# Altium footprint library MyComponents_v2.5.PcbLib: 403 footprints (part 12 of 26)
Each footprint in its own frame and in the unit in brackets; x right, y up, seen from the top. Pads: shape width x height; smd on the part's side, far side on the other; paste and mask are expansions set on the pad; w line width, h text height; cw(c..) or ccw(c..) is an arc to the next point about the centre after c.
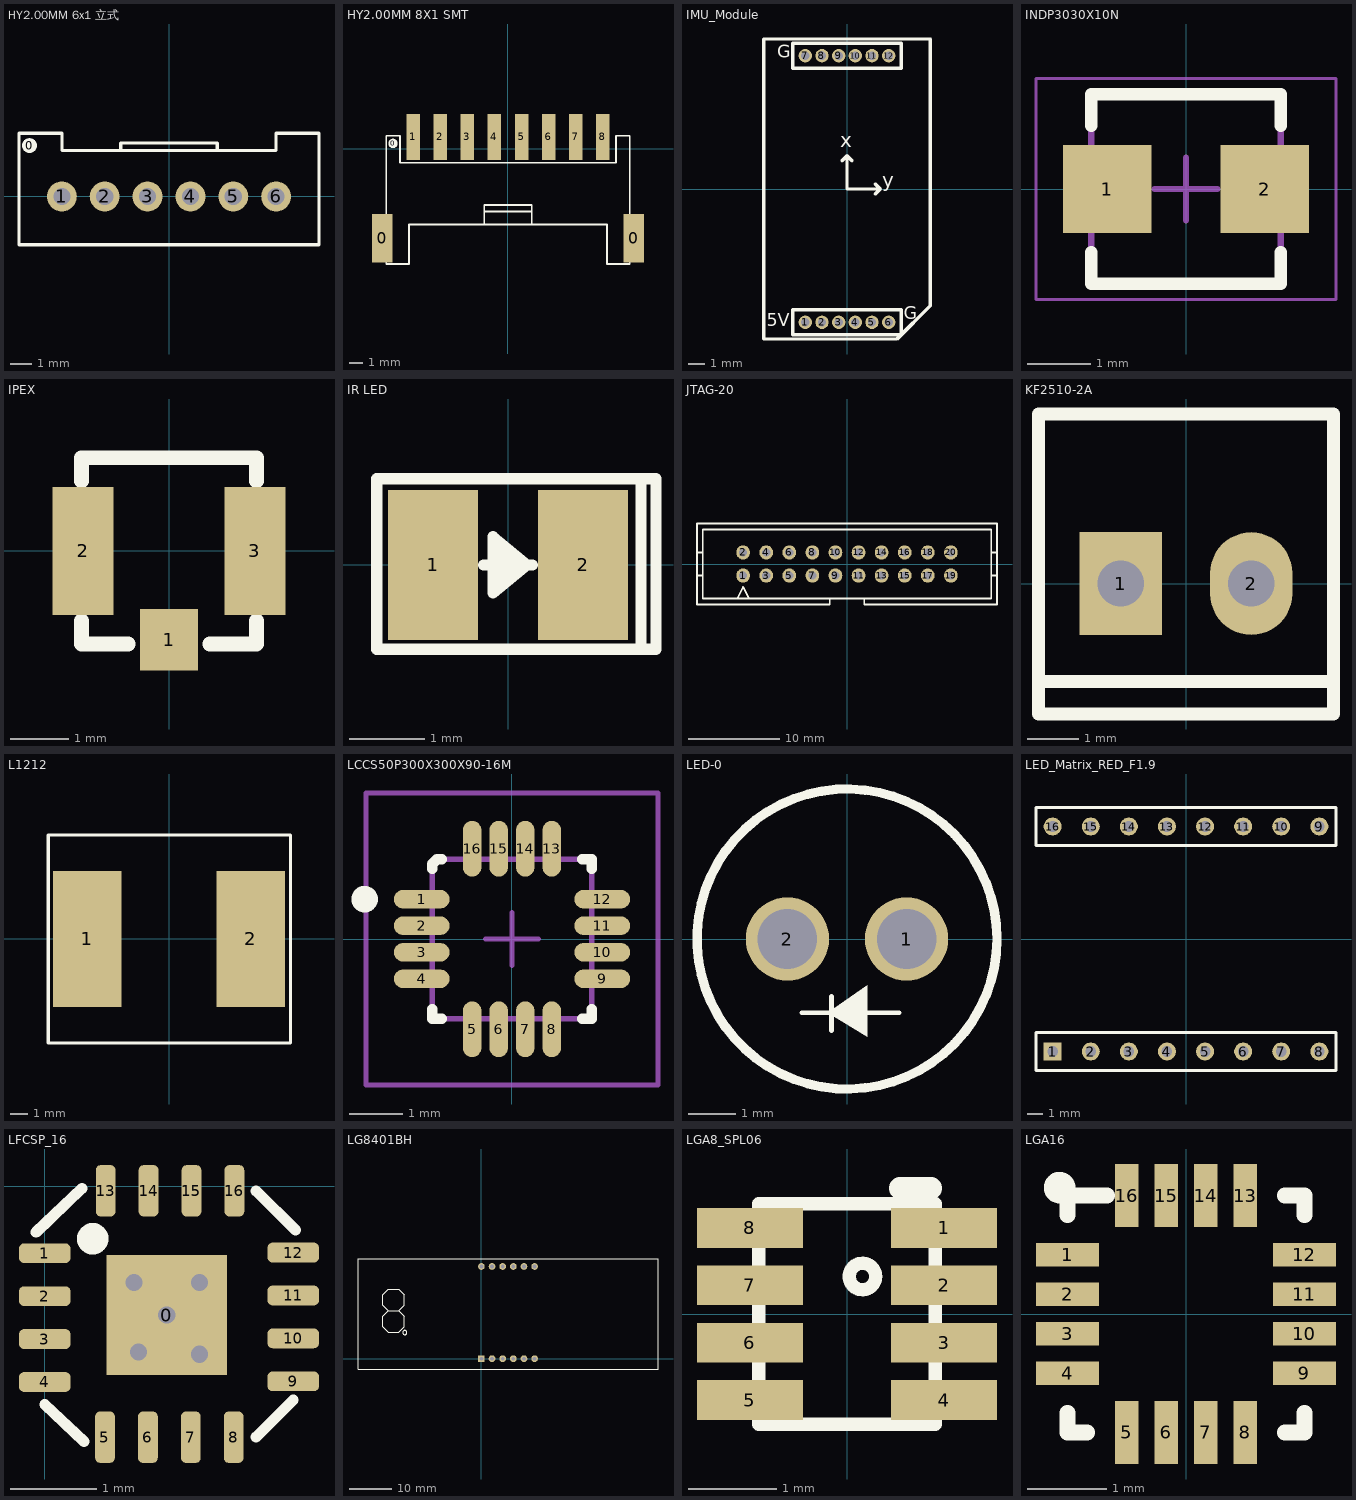
[diagram p11: the footprints below, top view; thin cyan lines are the x and y axes]

## HY2.00MM 6x1 立式 [mm]
pads (7):
  round 0.7 on Top Overlay: 0(-6.51,2.375)
  round 1.4 hole 0.8: 1(-5,0) 2(-3,0) 3(-1,0) 4(1,0) 5(3,0) 6(5,0)
Top Overlay:
  lines w0.15: -2.25,2.15 -2.25,2.5 2.25,2.5 2.25,2.15 ; 7,2.946 7,-2.25 -7,-2.25 -7,2.95 -5,2.95 -5,2.15 5,2.15 5,2.95 7,2.95

## HY2.00MM 8X1 SMT [mm]
pads (11):
  rect 1.5x3.6 smd: 0(-9.3,-6.635) 0(9.3,-6.635)
  round 0.7 on Top Overlay: 0(-8.51,0.391)
  rect 1x3.4 smd: 1(-7,0.865) 2(-5,0.865) 3(-3,0.865) 4(-1,0.865) 5(1,0.865) 6(3,0.865) 7(5,0.865) 8(7,0.865)
Top Overlay:
  lines w0.127: -8,-1.042 -8,0.957 ; -8,-1.041 -1.915,-1.041 8,-1.041 ; -8,0.966 -9,0.966 -9,-8.534 -7.327,-8.534 -7.327,-5.613 -4.58,-5.613 -3,-5.613 0.58,-5.613 7.327,-5.613 7.327,-8.534 9,-8.534 9,0.966 8,0.966 ; -1.75,-5.613 -1.75,-4.648 ; -0.354,-4.648 1.754,-4.648 1.754,-4.166 -0.354,-4.166 ; 0.354,-4.648 -1.754,-4.648 -1.754,-4.166 0.354,-4.166 ; 1.75,-5.613 1.75,-4.648 ; 8,-1.042 8,0.957

## IMU_Module [mm]
pads (12):
  round 0.8 hole 0.5: 1(-2.5,-8) 2(-1.5,-8) 3(-0.5,-8) 4(0.5,-8) 5(1.5,-8) 6(2.5,-8) 7(-2.5,8) 8(-1.5,8) 9(-0.5,8) 10(0.5,8) 11(1.5,8) 12(2.5,8)
Top Overlay:
  lines w0.2: -0.3,1.7 0,2 ; 0.3,1.7 0,2 ; 1.7,-0.3 2,0 ; 1.7,0.3 2,0 ; -3.25,7.25 -3.25,7.25 ; -3.25,7.25 -3.25,8.75 ; -3.25,7.25 3.25,7.25 3.25,8.75 -3.25,8.75 ; -3.25,8.75 -3.25,8.75 ; 0,2 0,2 ; 0,2 0,0 2,0 ; 2,0 2,0 ; 2,0 2,0 ; 5,9 -5,9 -5,-9 3,-9 5,-7 5,9 ; 5,9 5,9 ; -3.25,-8.75 3.25,-8.75 3.25,-7.25 -3.25,-7.25 -3.25,-8.75
  text "x" at -0.4,2.2 h1.5
  text "y" at 2.1,-0.2 h1.5
  text "5V" at -4.8,-8.5 h1.3
  text "G" at -4.2,7.6 h1.3
  text "G" at 3.4,-8.1 h1.3
3D body "ICM20602+AK8975.step": height 5.2, standoff -0.5, extent -5,-9 5,9
3D body "female_header_1.0mm 6p.STEP": height 2, standoff -2, extent -3.25,7.25 3.25,8.75
3D body "female_header_1.0mm 6p.STEP": height 2, standoff -2, extent -3.25,-8.75 3.25,-7.25

## INDP3030X10N [mm] "Precision Wire Wound Inductor, 2-Leads, Body 3.00x2.95mm, IPC Medium Density"
height 1
pads (2):
  rect 1.4x1.4 smd: 1(-1.25,0) 2(1.25,0)
Top Overlay:
  lines w0.2: -1.5,-1 -1.5,-1.5 1.5,-1.5 1.5,-1 ; -1.5,1 -1.5,1.5 1.5,1.5 1.5,1
Mechanical 13:
  lines w0.1: -1.5,-1.475 1.5,-1.475 1.5,1.475 -1.5,1.475 -1.5,-1.475
Mechanical 15:
  lines w0.05: -2.375,-1.75 2.375,-1.75 2.375,1.75 -2.375,1.75 -2.375,-1.75
  lines w0.1: -0.5,0 0.5,0 ; 0,-0.5 0,0.5
3D body: height 1, standoff 0, extent -1.5,-1.475 1.5,1.475

## IPEX [mm]
pads (3):
  rect 1x1.05 smd: 1(0,-1.525)
  rect 1.05x2.2 smd: 2(-1.475,0) 3(1.475,0)
Top Overlay:
  lines w0.254: -1.5,-1.2 -1.5,-1.6 -0.7,-1.6 ; -1.5,1.2 -1.5,1.6 1.5,1.6 1.5,1.2 ; 0.7,-1.6 1.5,-1.6 1.5,-1.2
3D body "User Library-IPEX.STEP": height 1.25, standoff -0.01, extent -1.5,-1.55 1.5,1.55

## IR LED [mm] "IR  LED for 测评测速模块"
pads (2):
  rect 1.2x2 smd: 1(-1,0) 2(1,0)
Top Overlay:
  lines w0.15: -0.325,0 0.325,0 ; -0.1,-0.15 -0.025,-0.075 -0.025,0.05 -0.2,0.225 -0.2,0.375 ; 1.775,-1.125 1.775,1.125 ; -0.2,0.375 -0.2,-0.375 0.25,0 -0.2,0.375 ; -1.75,-1.125 1.975,-1.125 1.975,1.15 -1.75,1.15 -1.75,-1.125

## JTAG-20 [mm]
pads (20):
  oval 1.5x1.575 hole 0.9: 1(-11.43,-1.27) 2(-11.43,1.27) 3(-8.89,-1.27) 4(-8.89,1.27) 5(-6.35,-1.27) 6(-6.35,1.27) 7(-3.81,-1.27) 8(-3.81,1.27) 9(-1.27,-1.27) 10(-1.27,1.27) 11(1.27,-1.27) 12(1.27,1.27) 13(3.81,-1.27) 14(3.81,1.27) 15(6.35,-1.27) 16(6.35,1.27) 17(8.89,-1.27) 18(8.89,1.27) 19(11.43,-1.27) 20(11.43,1.27)
Top Overlay:
  lines w0.203: -16.51,-1.27 -15.875,-1.27 ; -16.51,1.27 -15.875,1.27 ; -12.065,-3.81 -11.43,-2.54 -10.795,-3.81 ; -8.625,-4.445 -1.905,-4.445 -1.905,-3.81 ; -8.255,-4.445 -16.51,-4.445 -16.51,4.445 16.51,4.445 16.51,-4.445 8.255,-4.445 1.905,-4.445 1.905,-3.81 ; 15.875,-1.27 16.51,-1.27 ; 15.875,1.27 16.51,1.27 ; -1.905,-3.81 -15.875,-3.81 -15.875,3.81 15.875,3.81 15.875,-3.81 1.905,-3.81 ; -1.905,-3.81 1.905,-3.81
3D body "User Library-LP20V.STEP": height 9.46, standoff -3.2, extent -16.459,-4.524 16.561,4.676

## KF2510-2A [mm]
pads (2):
  rect 1.6x2 hole 0.9: 1(-1.27,0)
  oval 1.6x2 hole 0.9: 2(1.27,0)
Top Overlay:
  lines w0.254: -2.87,-1.905 2.87,-1.905 ; -2.87,-2.54 -2.87,3.3 2.87,3.3 2.87,-2.54 -2.87,-2.54
3D body: height 11.2, standoff 3, extent 1.016,-0.254 1.524,0.254
3D body: height 11.2, standoff 3, extent -1.524,-0.254 -1.016,0.254
3D body: height 3, standoff 0, extent -2.794,-1.778 2.794,3.302
3D body: height 11.2, standoff 0, extent -2.794,-2.54 2.794,-1.778

## L1212 [mm]
pads (2):
  rect 4x8 smd: 1(-4.8,0) 2(4.8,0)
Top Overlay:
  lines w0.2: -7.079,-6.1 -7.079,6.1 7.129,6.1 7.129,-6.1 -7.079,-6.1
3D body "Inductor12x12x6.step": height 6.21, standoff -0.09, extent -6.125,-6.1 6.075,6.1

## LCCS50P300X300X90-16M [mm] "LCC, 16-Pins, Body 3.0x3.0mm (max), Pitch 0.50mm, IPC Low Density"
height 0.9
pads (16):
  oval 1.05x0.35 smd: 1(-1.7,0.75) 2(-1.7,0.25) 3(-1.7,-0.25) 4(-1.7,-0.75) 9(1.7,-0.75) 10(1.7,-0.25) 11(1.7,0.25) 12(1.7,0.75)
  oval 0.35x1.05 smd: 5(-0.75,-1.7) 6(-0.25,-1.7) 7(0.25,-1.7) 8(0.75,-1.7) 13(0.75,1.7) 14(0.25,1.7) 15(-0.25,1.7) 16(-0.75,1.7)
Top Overlay:
  circle w0.25: c-2.775,0.75 r0.125
  lines w0.2: -1.5,-1.325 -1.5,-1.5 -1.325,-1.5 ; -1.5,1.325 -1.5,1.412 -1.412,1.5 -1.325,1.5 ; 1.325,-1.5 1.5,-1.5 1.5,-1.325 ; 1.325,1.5 1.5,1.5 1.5,1.325
Mechanical 13:
  lines w0.1: -1.5,-1.5 -1.5,1.412 -1.412,1.5 1.5,1.5 1.5,-1.5 -1.5,-1.5
Mechanical 15:
  lines w0.1: -0.5,0 0.5,0 ; 0,-0.5 0,0.5 ; -2.75,-2.75 -2.75,2.75 2.75,2.75 2.75,-2.75 -2.75,-2.75
3D body: height 0.9, standoff 0, extent -1.5,-1.5 1.5,1.5

## LED-0 [mil] "LED; 2 Leads"
pads (2):
  round 70 hole 50: 1(50,0) 2(-50,0)
Top Overlay:
  circle w7.87: c0,0 r125.98
  region: 17,-39 17,-82 -16,-62
  lines w3.94: -38,-62 44,-62 ; -13,-77 -13,-48

## LED_Matrix_RED_F1.9 [mm] "LED直径1.9mm 边长20mm"
pads (16):
  rect 1.2x1.2 hole 0.7: 1(-8.89,-7.5)
  round 1.2 hole 0.7: 2(-6.35,-7.5) 3(-3.81,-7.5) 4(-1.27,-7.5) 5(1.27,-7.5) 6(3.81,-7.5) 7(6.35,-7.5) 8(8.89,-7.5) 9(8.89,7.5) 10(6.35,7.5) 11(3.81,7.5) 12(1.27,7.5) 13(-1.27,7.5) 14(-3.81,7.5) 15(-6.35,7.5) 16(-8.89,7.5)
Top Overlay:
  lines w0.2: -10,-8.77 10,-8.77 10,-6.23 -10,-6.23 -10,-8.77 ; -10,6.23 -10,8.77 10,8.77 10,6.23 -10,6.23

## LFCSP_16 [mm]
pads (17):
  rect 1.4x1.4 smd: 0(1.422,-1.499)
  rrect50% 0.6x0.23 smd: 1(0,-0.778) 2(0,-1.278) 3(0,-1.778) 4(0,-2.278) 9(2.896,-2.27) 10(2.896,-1.77) 11(2.896,-1.27) 12(2.896,-0.77)
  rrect50% 0.23x0.6 smd: 5(0.702,-2.921) 6(1.202,-2.921) 7(1.702,-2.921) 8(2.202,-2.921) 13(0.71,-0.051) 14(1.21,-0.051) 15(1.71,-0.051) 16(2.21,-0.051)
via 1.803,-1.956 diameter 0.3 hole 0.2
via 1.803,-1.118 diameter 0.3 hole 0.2
via 1.041,-1.118 diameter 0.3 hole 0.2
via 1.092,-1.93 diameter 0.3 hole 0.2
via 1.422,-1.499 diameter 0.3 hole 0.2
Top Overlay:
  lines w0.127: -0.102,-0.533 0.432,-0.025 ; 0,-2.54 0.457,-2.972 ; 2.464,-2.921 2.896,-2.489 ; 2.464,-0.051 2.921,-0.508
  lines w0.254: 0.615,-0.617 cw(c0.559,-0.61) 0.615,-0.614

## LG8401BH [mm] "四位 0.36英寸 数码管"
pads (12):
  rect 1.6x1.6 hole 0.9: 1(0,0)
  round 1.6 hole 0.9: 2(2.54,0) 3(5.08,0) 4(7.62,0) 5(10.16,0) 6(12.7,0) 7(12.7,22) 8(10.16,22) 9(7.62,22) 10(5.08,22) 11(2.54,22) 12(0,22)
Top Overlay:
  circle w0.254: c-18.288,6.223 r0.508
  lines w0.254: -22.225,11.43 -23.495,10.16 -23.495,7.62 -22.225,6.35 -19.685,6.35 -18.415,7.62 -18.415,10.16 -19.685,11.43 ; -22.225,11.43 -23.495,12.7 -23.495,15.24 -22.225,16.51 -19.685,16.51 -18.415,15.24 -18.415,12.7 -19.685,11.43 ; -22.225,11.43 -19.685,11.43 ; -29.45,-2.54 42.15,-2.54 42.15,23.85 -29.45,23.85 -29.45,-2.54

## LGA8_SPL06 [mm] "IST8310"
pads (8):
  rect 1.2x0.45 smd: 1(1.1,0.975) 2(1.1,0.325) 3(1.1,-0.325) 4(1.1,-0.975) 5(-1.1,-0.975) 6(-1.1,-0.325) 7(-1.1,0.325) 8(-1.1,0.975)
Top Overlay:
  circle w0.15: c0.175,0.425 r0.15
  lines w0.15: -1,-1.25 -1,1.25 1,1.25 1,-1.25 -1,-1.25
  lines w0.25: 0.6,1.425 0.95,1.425

## LGA16 [mm] "IST8310"
pads (16):
  rect 0.8x0.3 smd: 1(-1.5,0.75) 2(-1.5,0.25) 3(-1.5,-0.25) 4(-1.5,-0.75) 9(1.5,-0.75) 10(1.5,-0.25) 11(1.5,0.25) 12(1.5,0.75)
  rect 0.3x0.8 smd: 5(-0.75,-1.5) 6(-0.25,-1.5) 7(0.25,-1.5) 8(0.75,-1.5) 13(0.75,1.5) 14(0.25,1.5) 15(-0.25,1.5) 16(-0.75,1.5)
Top Overlay:
  circle w0.2: c-1.6,1.6 r0.1
  lines w0.2: -1.5,-1.25 -1.5,-1.5 ; -1.5,1.25 -1.5,1.5 -1,1.5 ; -1.25,-1.5 -1.5,-1.5 ; 1.25,-1.5 1.5,-1.5 ; 1.25,1.5 1.5,1.5 1.5,1.25 ; 1.5,-1.25 1.5,-1.5 ; -1.5,-1.5 -1.5,-1.5 ; 1.5,-1.5 1.5,-1.5
3D body "LGA16.step": height 1.01, standoff -0.01, extent -1.5,-1.5 1.5,1.5